# Altium footprint library JDR2812（公开）.PcbLib: 142 footprints (part 7 of 9)
Each footprint in its own frame and in the unit in brackets; x right, y up, seen from the top. Pads: shape width x height; smd on the part's side, far side on the other; paste and mask are expansions set on the pad; w line width, h text height; cw(c..) or ccw(c..) is an arc to the next point about the centre after c.
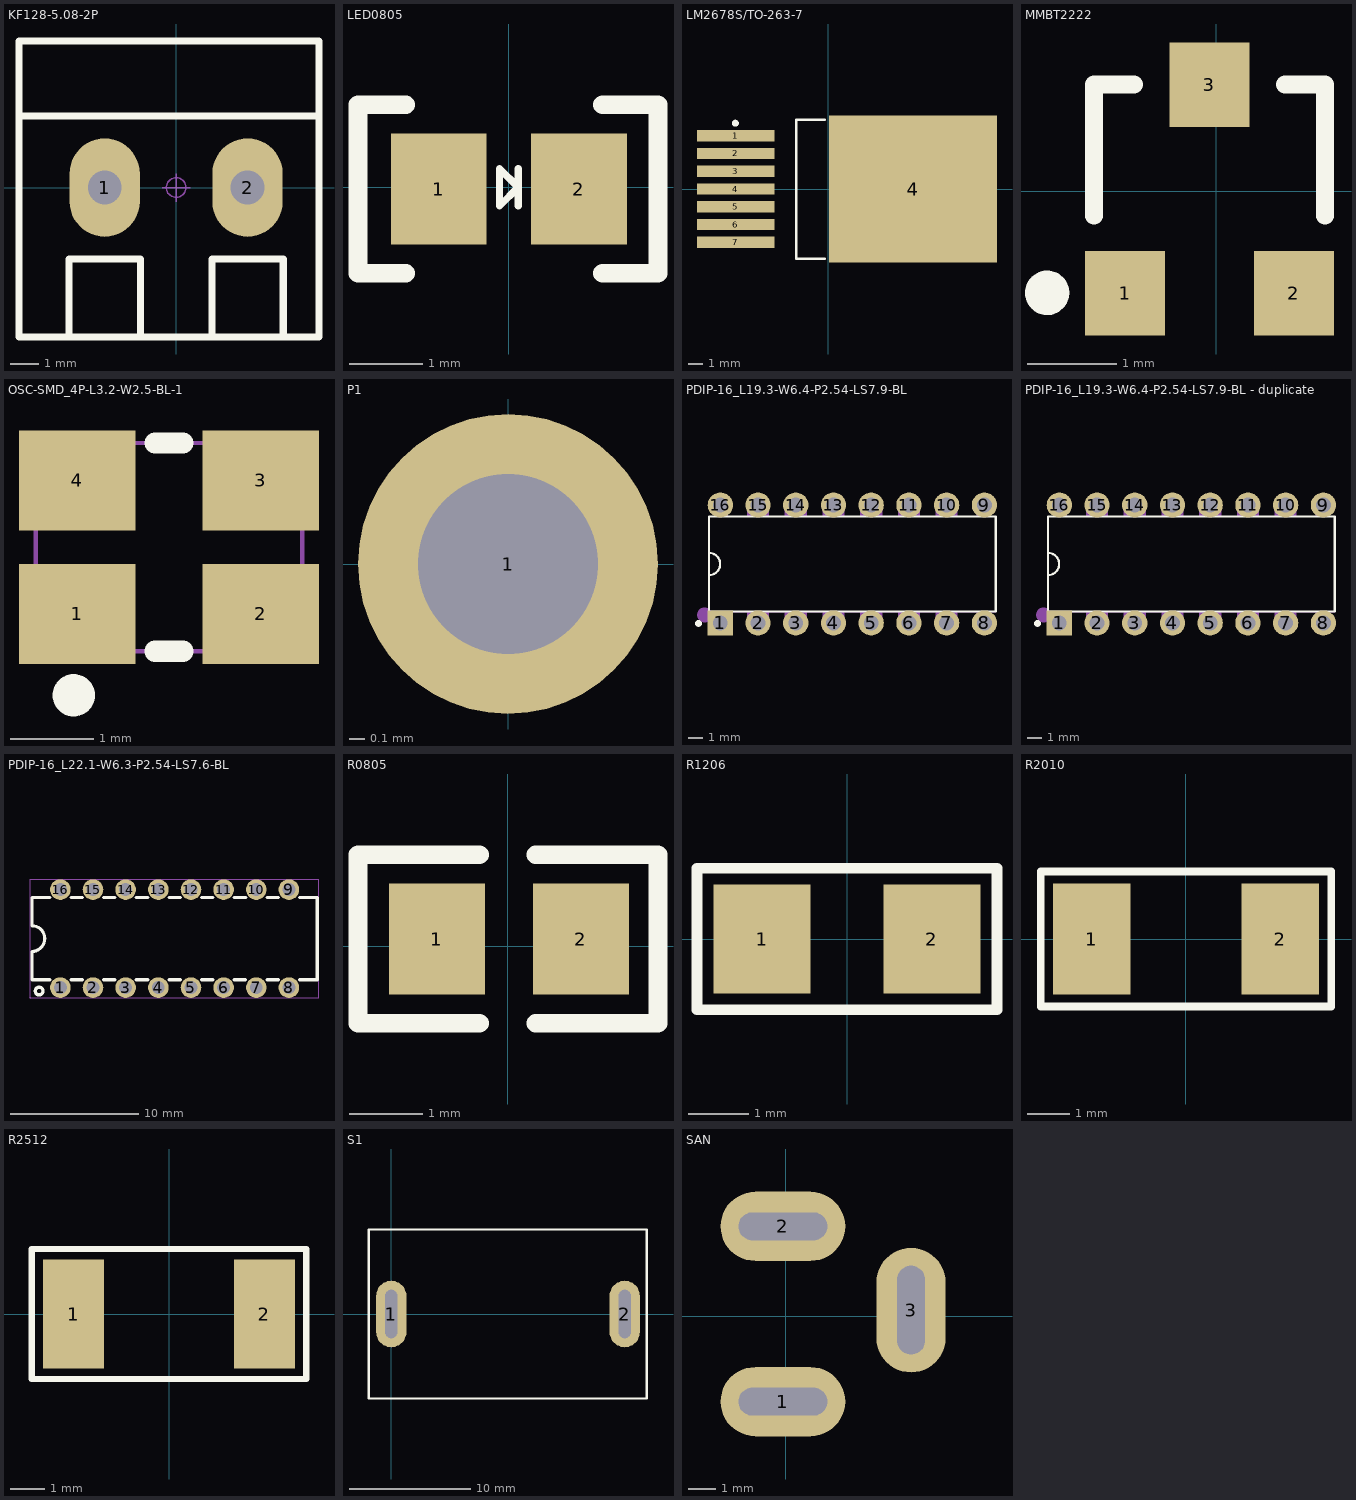
[diagram p6: the footprints below, top view; thin cyan lines are the x and y axes]

## KF128-5.08-2P [mm] "螺钉式接线端子，脚距5.08mm"
pads (2):
  oval 2.5x3.5 hole 1.2: 1(-2.54,0) 2(2.54,0)
Top Overlay:
  lines w0.254: -5.588,2.54 5.08,2.54 ; -3.81,-5.309 -3.81,-2.54 -1.27,-2.54 -1.27,-5.309 ; 1.27,-5.309 1.27,-2.54 3.81,-2.54 3.81,-5.309 ; -5.588,-5.309 5.08,-5.309 5.08,5.207 -5.588,5.207 -5.588,-5.309
Mechanical 15:
  circle w0.05: c0,0 r0.35
  lines w0.05: -0.5,0 0.5,0 ; 0,-0.5 0,0.5
3D body "KF128-5.08.STEP": height 14.15, standoff -3.95, extent -0.5,-5.3 5.08,5.2
3D body "KF128-5.08.STEP": height 14.15, standoff -3.95, extent -5.58,-5.3 0,5.2

## LED0805 [mm]
pads (2):
  rect 1.3x1.5 smd: 1(-0.95,-0.023) 2(0.95,-0.023)
Top Overlay:
  lines w0.1: 0.127,-0.254 0.127,0.254 ; -0.127,-0.254 -0.127,0.254 0.127,0 -0.127,-0.254
  lines w0.254: -1.397,-1.166 -2.045,-1.166 -2.045,1.12 -1.397,1.12 ; 1.27,-1.166 2.022,-1.166 2.022,1.12 1.27,1.12

## LM2678S/TO-263-7 [mm]
pads (8):
  rect 5.55x0.8 smd: 1(-6.587,3.835) 2(-6.587,2.565) 3(-6.587,1.295) 4(-6.587,0.025) 5(-6.587,-1.245) 6(-6.587,-2.515) 7(-6.587,-3.785)
  rect 12x10.5 smd: 4(6.071,0.025)
Top Overlay:
  circle w0.25: c-6.627,4.724 r0.125
  lines w0.2: -0.254,-4.953 -2.269,-4.953 -2.269,4.975 -0.254,4.975

## MMBT2222 [mm]
pads (3):
  rect 0.9x0.95 smd: 1(-1.026,-1.15) 2(0.874,-1.15) 3(-0.076,1.2)
Top Overlay:
  circle w0.25: c-1.903,-1.143 r0.125
  lines w0.2: -1.376,-0.275 -1.376,1.2 -0.926,1.2 ; 0.774,1.2 1.224,1.2 1.224,-0.275

## OSC-SMD_4P-L3.2-W2.5-BL-1 [mm]
pads (4):
  rect 1.4x1.2 smd paste+0 mask+0.05: 1(-1193.1,-1192.695) 2(-1190.9,-1192.695) 3(-1190.9,-1191.095) 4(-1193.1,-1191.095)
Top Overlay:
  circle w0.254: c-1193.143,-1193.673 r0.127
  lines w0.254: -1192.169,-1193.145 -1191.831,-1193.145 ; -1192.169,-1190.645 -1191.831,-1190.645
Mechanical 6:
  circle w0.254: c-1193.292,-1192.92 r0.127
  region: -1193.461,-1191.119 -1192.826,-1191.119 -1192.826,-1191.246 -1193.461,-1191.246
  region: -1193.207,-1191.5 -1193.207,-1190.865 -1193.08,-1190.865 -1193.08,-1191.5
  region: -1191.238,-1192.707 -1190.603,-1192.707 -1190.603,-1192.834 -1191.238,-1192.834
Mechanical 15:
  region: -1193.536,-1193.145 -1193.554,-1193.101 -1193.6,-1193.082 -1193.646,-1193.101 -1193.664,-1193.145 -1193.646,-1193.189 -1193.6,-1193.208 -1193.554,-1193.189
  region: -1191.4,-1193.045 -1191.4,-1192.395 -1190.5,-1192.395 -1190.5,-1193.045
  region: -1193.5,-1193.045 -1193.5,-1192.395 -1192.6,-1192.395 -1192.6,-1193.045
  region: -1191.4,-1191.395 -1191.4,-1190.745 -1190.5,-1190.745 -1190.5,-1191.395
  region: -1193.5,-1191.395 -1193.5,-1190.745 -1192.6,-1190.745 -1192.6,-1191.395
  lines w0.051: -1193.6,-1193.145 -1193.6,-1190.645 -1190.4,-1190.645 -1190.4,-1193.145 -1193.6,-1193.145

## P1 [mm]
height 8.2
pads (1):
  round 2 hole 1.2: 1(0,0)

## PCBComponent_1 [mm]

## PDIP-16_L19.3-W6.4-P2.54-LS7.9-BL [mm]
pads (16):
  rect 1.7x1.7 hole 1: 1(-1192.23,-1192.95)
  round 1.7 hole 1 copper offset 0,0: 2(-1189.69,-1192.95) 3(-1187.15,-1192.95) 4(-1184.61,-1192.95) 5(-1182.07,-1192.95) 6(-1179.53,-1192.95) 7(-1176.99,-1192.95) 8(-1174.45,-1192.95)
  round 1.7 hole 1: 9(-1174.45,-1185.01) 10(-1176.99,-1185.01) 11(-1179.53,-1185.01) 12(-1182.07,-1185.01) 13(-1184.61,-1185.01) 14(-1187.15,-1185.01) 15(-1189.69,-1185.01) 16(-1192.23,-1185.01)
Top Overlay:
  circle w0.254: c-1193.7,-1192.98 r0.1
  lines w0.15: -1192.99,-1189.729 ccw(c-1192.99,-1188.98) -1192.99,-1188.231 ; -1192.99,-1192.18 -1192.99,-1185.78 -1173.69,-1185.78 -1173.69,-1192.18 -1192.99,-1192.18
Mechanical 6:
  circle w0.5: c-1193.29,-1192.41 r0.25
Mechanical 15:
  region: -1186.42,-1184.885 -1187.88,-1184.885 -1187.88,-1185.783 -1186.42,-1185.783
  region: -1183.88,-1184.885 -1185.34,-1184.885 -1185.34,-1185.783 -1183.88,-1185.783
  region: -1181.34,-1184.885 -1182.8,-1184.885 -1182.8,-1185.783 -1181.34,-1185.783
  region: -1178.8,-1184.885 -1180.26,-1184.885 -1180.26,-1185.783 -1178.8,-1185.783
  region: -1176.26,-1184.885 -1177.72,-1184.885 -1177.72,-1185.783 -1176.26,-1185.783
  region: -1177.72,-1193.075 -1176.26,-1193.075 -1176.26,-1192.177 -1177.72,-1192.177
  region: -1180.26,-1193.075 -1178.8,-1193.075 -1178.8,-1192.177 -1180.26,-1192.177
  region: -1182.8,-1193.075 -1181.34,-1193.075 -1181.34,-1192.177 -1182.8,-1192.177
  region: -1185.34,-1193.075 -1183.88,-1193.075 -1183.88,-1192.177 -1185.34,-1192.177
  region: -1187.88,-1193.075 -1186.42,-1193.075 -1186.42,-1192.177 -1187.88,-1192.177
  region: -1190.42,-1193.075 -1188.96,-1193.075 -1188.96,-1192.177 -1190.42,-1192.177
  region: -1174.2,-1184.885 -1174.95,-1184.885 -1174.95,-1185.783 -1174.198,-1185.783
  region: -1188.96,-1184.885 -1190.42,-1184.885 -1190.42,-1185.783 -1188.96,-1185.783
  region: -1191.73,-1184.885 -1192.48,-1184.885 -1192.48,-1185.783 -1191.73,-1185.783
  region: -1174.95,-1193.075 -1174.2,-1193.075 -1174.2,-1192.177 -1174.95,-1192.177
  region: -1192.48,-1193.075 -1191.73,-1193.075 -1191.73,-1192.177 -1192.482,-1192.177
  region: -1192.48,-1192.825 -1191.98,-1192.825 -1191.98,-1193.075 -1192.48,-1193.075
  region: -1189.44,-1192.825 -1189.44,-1193.075 -1189.94,-1193.075 -1189.94,-1192.825
  region: -1176.74,-1192.825 -1176.74,-1193.075 -1177.24,-1193.075 -1177.24,-1192.825
  region: -1174.2,-1192.825 -1174.2,-1193.075 -1174.7,-1193.075 -1174.7,-1192.825
  region: -1186.9,-1192.825 -1186.9,-1193.075 -1187.4,-1193.075 -1187.4,-1192.825
  region: -1184.36,-1192.825 -1184.36,-1193.075 -1184.86,-1193.075 -1184.86,-1192.825
  region: -1179.28,-1192.825 -1179.28,-1193.075 -1179.78,-1193.075 -1179.78,-1192.825
  region: -1181.82,-1192.825 -1181.82,-1193.075 -1182.32,-1193.075 -1182.32,-1192.825
  region: -1174.2,-1184.885 -1174.2,-1185.135 -1174.7,-1185.135 -1174.7,-1184.885
  region: -1176.74,-1184.885 -1176.74,-1185.135 -1177.24,-1185.135 -1177.24,-1184.885
  region: -1179.28,-1184.885 -1179.28,-1185.135 -1179.78,-1185.135 -1179.78,-1184.885
  region: -1181.82,-1184.885 -1181.82,-1185.135 -1182.32,-1185.135 -1182.32,-1184.885
  region: -1184.36,-1184.885 -1184.36,-1185.135 -1184.86,-1185.135 -1184.86,-1184.885
  region: -1186.9,-1184.885 -1186.9,-1185.135 -1187.4,-1185.135 -1187.4,-1184.885
  region: -1189.44,-1184.885 -1189.44,-1185.135 -1189.94,-1185.135 -1189.94,-1184.885
  region: -1191.98,-1184.885 -1191.98,-1185.135 -1192.48,-1185.135 -1192.48,-1184.885
  region: -1192.926,-1193.075 -1192.944,-1193.031 -1192.99,-1193.012 -1193.036,-1193.031 -1193.054,-1193.075 -1193.036,-1193.119 -1192.99,-1193.138 -1192.944,-1193.119 -1192.926,-1193.075
  lines w0.051: -1192.99,-1192.18 -1173.69,-1192.18 -1173.69,-1185.78 -1192.99,-1185.78 -1192.99,-1192.18

## PDIP-16_L19.3-W6.4-P2.54-LS7.9-BL - duplicate [mm]
pads (16):
  rect 1.7x1.7 hole 1: 1(-1192.23,-1192.95)
  round 1.7 hole 1 copper offset 0,0: 2(-1189.69,-1192.95) 3(-1187.15,-1192.95) 4(-1184.61,-1192.95) 5(-1182.07,-1192.95) 6(-1179.53,-1192.95) 7(-1176.99,-1192.95) 8(-1174.45,-1192.95)
  round 1.7 hole 1: 9(-1174.45,-1185.01) 10(-1176.99,-1185.01) 11(-1179.53,-1185.01) 12(-1182.07,-1185.01) 13(-1184.61,-1185.01) 14(-1187.15,-1185.01) 15(-1189.69,-1185.01) 16(-1192.23,-1185.01)
Top Overlay:
  circle w0.254: c-1193.7,-1192.98 r0.1
  lines w0.15: -1192.99,-1189.729 ccw(c-1192.99,-1188.98) -1192.99,-1188.231 ; -1192.99,-1192.18 -1192.99,-1185.78 -1173.69,-1185.78 -1173.69,-1192.18 -1192.99,-1192.18
Mechanical 6:
  circle w0.5: c-1193.29,-1192.41 r0.25
Mechanical 15:
  region: -1186.42,-1184.885 -1187.88,-1184.885 -1187.88,-1185.783 -1186.42,-1185.783
  region: -1183.88,-1184.885 -1185.34,-1184.885 -1185.34,-1185.783 -1183.88,-1185.783
  region: -1181.34,-1184.885 -1182.8,-1184.885 -1182.8,-1185.783 -1181.34,-1185.783
  region: -1178.8,-1184.885 -1180.26,-1184.885 -1180.26,-1185.783 -1178.8,-1185.783
  region: -1176.26,-1184.885 -1177.72,-1184.885 -1177.72,-1185.783 -1176.26,-1185.783
  region: -1177.72,-1193.075 -1176.26,-1193.075 -1176.26,-1192.177 -1177.72,-1192.177
  region: -1180.26,-1193.075 -1178.8,-1193.075 -1178.8,-1192.177 -1180.26,-1192.177
  region: -1182.8,-1193.075 -1181.34,-1193.075 -1181.34,-1192.177 -1182.8,-1192.177
  region: -1185.34,-1193.075 -1183.88,-1193.075 -1183.88,-1192.177 -1185.34,-1192.177
  region: -1187.88,-1193.075 -1186.42,-1193.075 -1186.42,-1192.177 -1187.88,-1192.177
  region: -1190.42,-1193.075 -1188.96,-1193.075 -1188.96,-1192.177 -1190.42,-1192.177
  region: -1174.2,-1184.885 -1174.95,-1184.885 -1174.95,-1185.783 -1174.198,-1185.783
  region: -1188.96,-1184.885 -1190.42,-1184.885 -1190.42,-1185.783 -1188.96,-1185.783
  region: -1191.73,-1184.885 -1192.48,-1184.885 -1192.48,-1185.783 -1191.73,-1185.783
  region: -1174.95,-1193.075 -1174.2,-1193.075 -1174.2,-1192.177 -1174.95,-1192.177
  region: -1192.48,-1193.075 -1191.73,-1193.075 -1191.73,-1192.177 -1192.482,-1192.177
  region: -1192.48,-1192.825 -1191.98,-1192.825 -1191.98,-1193.075 -1192.48,-1193.075
  region: -1189.44,-1192.825 -1189.44,-1193.075 -1189.94,-1193.075 -1189.94,-1192.825
  region: -1176.74,-1192.825 -1176.74,-1193.075 -1177.24,-1193.075 -1177.24,-1192.825
  region: -1174.2,-1192.825 -1174.2,-1193.075 -1174.7,-1193.075 -1174.7,-1192.825
  region: -1186.9,-1192.825 -1186.9,-1193.075 -1187.4,-1193.075 -1187.4,-1192.825
  region: -1184.36,-1192.825 -1184.36,-1193.075 -1184.86,-1193.075 -1184.86,-1192.825
  region: -1179.28,-1192.825 -1179.28,-1193.075 -1179.78,-1193.075 -1179.78,-1192.825
  region: -1181.82,-1192.825 -1181.82,-1193.075 -1182.32,-1193.075 -1182.32,-1192.825
  region: -1174.2,-1184.885 -1174.2,-1185.135 -1174.7,-1185.135 -1174.7,-1184.885
  region: -1176.74,-1184.885 -1176.74,-1185.135 -1177.24,-1185.135 -1177.24,-1184.885
  region: -1179.28,-1184.885 -1179.28,-1185.135 -1179.78,-1185.135 -1179.78,-1184.885
  region: -1181.82,-1184.885 -1181.82,-1185.135 -1182.32,-1185.135 -1182.32,-1184.885
  region: -1184.36,-1184.885 -1184.36,-1185.135 -1184.86,-1185.135 -1184.86,-1184.885
  region: -1186.9,-1184.885 -1186.9,-1185.135 -1187.4,-1185.135 -1187.4,-1184.885
  region: -1189.44,-1184.885 -1189.44,-1185.135 -1189.94,-1185.135 -1189.94,-1184.885
  region: -1191.98,-1184.885 -1191.98,-1185.135 -1192.48,-1185.135 -1192.48,-1184.885
  region: -1192.926,-1193.075 -1192.944,-1193.031 -1192.99,-1193.012 -1193.036,-1193.031 -1193.054,-1193.075 -1193.036,-1193.119 -1192.99,-1193.138 -1192.944,-1193.119 -1192.926,-1193.075
  lines w0.051: -1192.99,-1192.18 -1173.69,-1192.18 -1173.69,-1185.78 -1192.99,-1185.78 -1192.99,-1192.18

## PDIP-16_L22.1-W6.3-P2.54-LS7.6-BL [mm]
pads (16):
  round 1.6 hole 1: 1(-1191.403,-1192.94) 2(-1188.863,-1192.94) 3(-1186.323,-1192.94) 4(-1183.783,-1192.94) 5(-1181.243,-1192.94) 6(-1178.703,-1192.94) 7(-1176.163,-1192.94) 8(-1173.623,-1192.94) 9(-1173.623,-1185.32) 10(-1176.163,-1185.32) 11(-1178.703,-1185.32) 12(-1181.243,-1185.32) 13(-1183.783,-1185.32) 14(-1186.323,-1185.32) 15(-1188.863,-1185.32) 16(-1191.403,-1185.32)
Top Overlay:
  circle w0.254: c-1193.053,-1193.21 r0.3
  lines w0.254: -1193.613,-1190.131 ccw(c-1193.618,-1189.131) -1193.613,-1188.132 -1193.613,-1185.932 -1192.232,-1185.932 -1192.513,-1185.932 ; -1193.613,-1190.13 -1193.613,-1192.33 -1192.234,-1192.33 -1192.513,-1192.33 ; -1172.513,-1192.33 -1172.792,-1192.33 -1171.413,-1192.33 -1171.413,-1185.93 ; -1172.513,-1185.932 -1172.794,-1185.932 -1171.513,-1185.932 ; -1190.574,-1185.932 -1189.692,-1185.932 -1190.574,-1185.932 ; -1190.572,-1192.33 -1189.694,-1192.33 -1190.572,-1192.33 ; -1188.034,-1185.932 -1187.152,-1185.932 -1188.034,-1185.932 ; -1188.032,-1192.33 -1187.154,-1192.33 -1188.032,-1192.33 ; -1185.494,-1185.932 -1184.612,-1185.932 -1185.494,-1185.932 ; -1185.492,-1192.33 -1184.614,-1192.33 -1185.492,-1192.33 ; -1182.954,-1185.932 -1182.072,-1185.932 -1182.954,-1185.932 ; -1182.952,-1192.33 -1182.074,-1192.33 -1182.952,-1192.33 ; -1180.414,-1185.932 -1179.532,-1185.932 -1180.414,-1185.932 ; -1180.412,-1192.33 -1179.534,-1192.33 -1180.412,-1192.33 ; -1177.874,-1185.932 -1176.992,-1185.932 -1177.874,-1185.932 ; -1177.872,-1192.33 -1176.994,-1192.33 -1177.872,-1192.33 ; -1175.334,-1185.932 -1174.452,-1185.932 -1175.334,-1185.932 ; -1175.332,-1192.33 -1174.454,-1192.33 -1175.332,-1192.33
Mechanical 15:
  drawing of 21 lines, arcs and shapes, not listed

## R0805 [mm]
pads (2):
  rect 1.3x1.5 smd: 1(-0.96,0.102) 2(0.991,0.102)
Top Overlay:
  lines w0.254: -0.381,-1.041 -2.029,-1.041 -2.029,1.245 -0.381,1.245 ; 0.381,-1.041 2.037,-1.041 2.037,1.245 0.381,1.245

## R1206 [mm]
pads (2):
  rect 1.6x1.8 smd: 1(-1.4,0) 2(1.4,0)
Top Overlay:
  lines w0.178: -2.476,-1.168 2.476,-1.168 2.476,1.168 -2.476,1.168 -2.476,-1.168

## R2010 [mm]
height 1.75
pads (2):
  rect 1.8x2.6 smd: 1(-2.2,0) 2(2.2,0)
Top Overlay:
  lines w0.178: -3.391,-1.575 -3.391,1.575 3.391,1.575 3.391,-1.575 -3.391,-1.575

## R2512 [mm]
pads (2):
  rect 1.8x3.2 smd: 1(-2.8,0) 2(2.8,0)
Top Overlay:
  lines w0.178: -4.026,-1.905 4.026,-1.905 4.026,1.905 -4.026,1.905 -4.026,-1.905

## S1 [mm]
pads (2):
  oval 2.5x5.5 hole 1 slot 4 at 90 deg: 1(0,0) 2(19.304,0)
Top Overlay:
  lines w0.2: -1.854,-6.985 21.107,-6.985 21.107,6.985 -1.854,6.985 -1.854,-6.985

## SAN [mm]
pads (3):
  oval 4.5x2.5 hole 1 slot 3.2 at 0 deg: 1(-0.102,-3.073) 2(-0.102,3.251)
  oval 2.5x4.5 hole 1 slot 3.2 at 90 deg: 3(4.521,0.229)